# Altium schematic symbol library TI Amplifiers and Linear Special Function Amplifier.SchLib: 708 symbols (part 3 of 34)
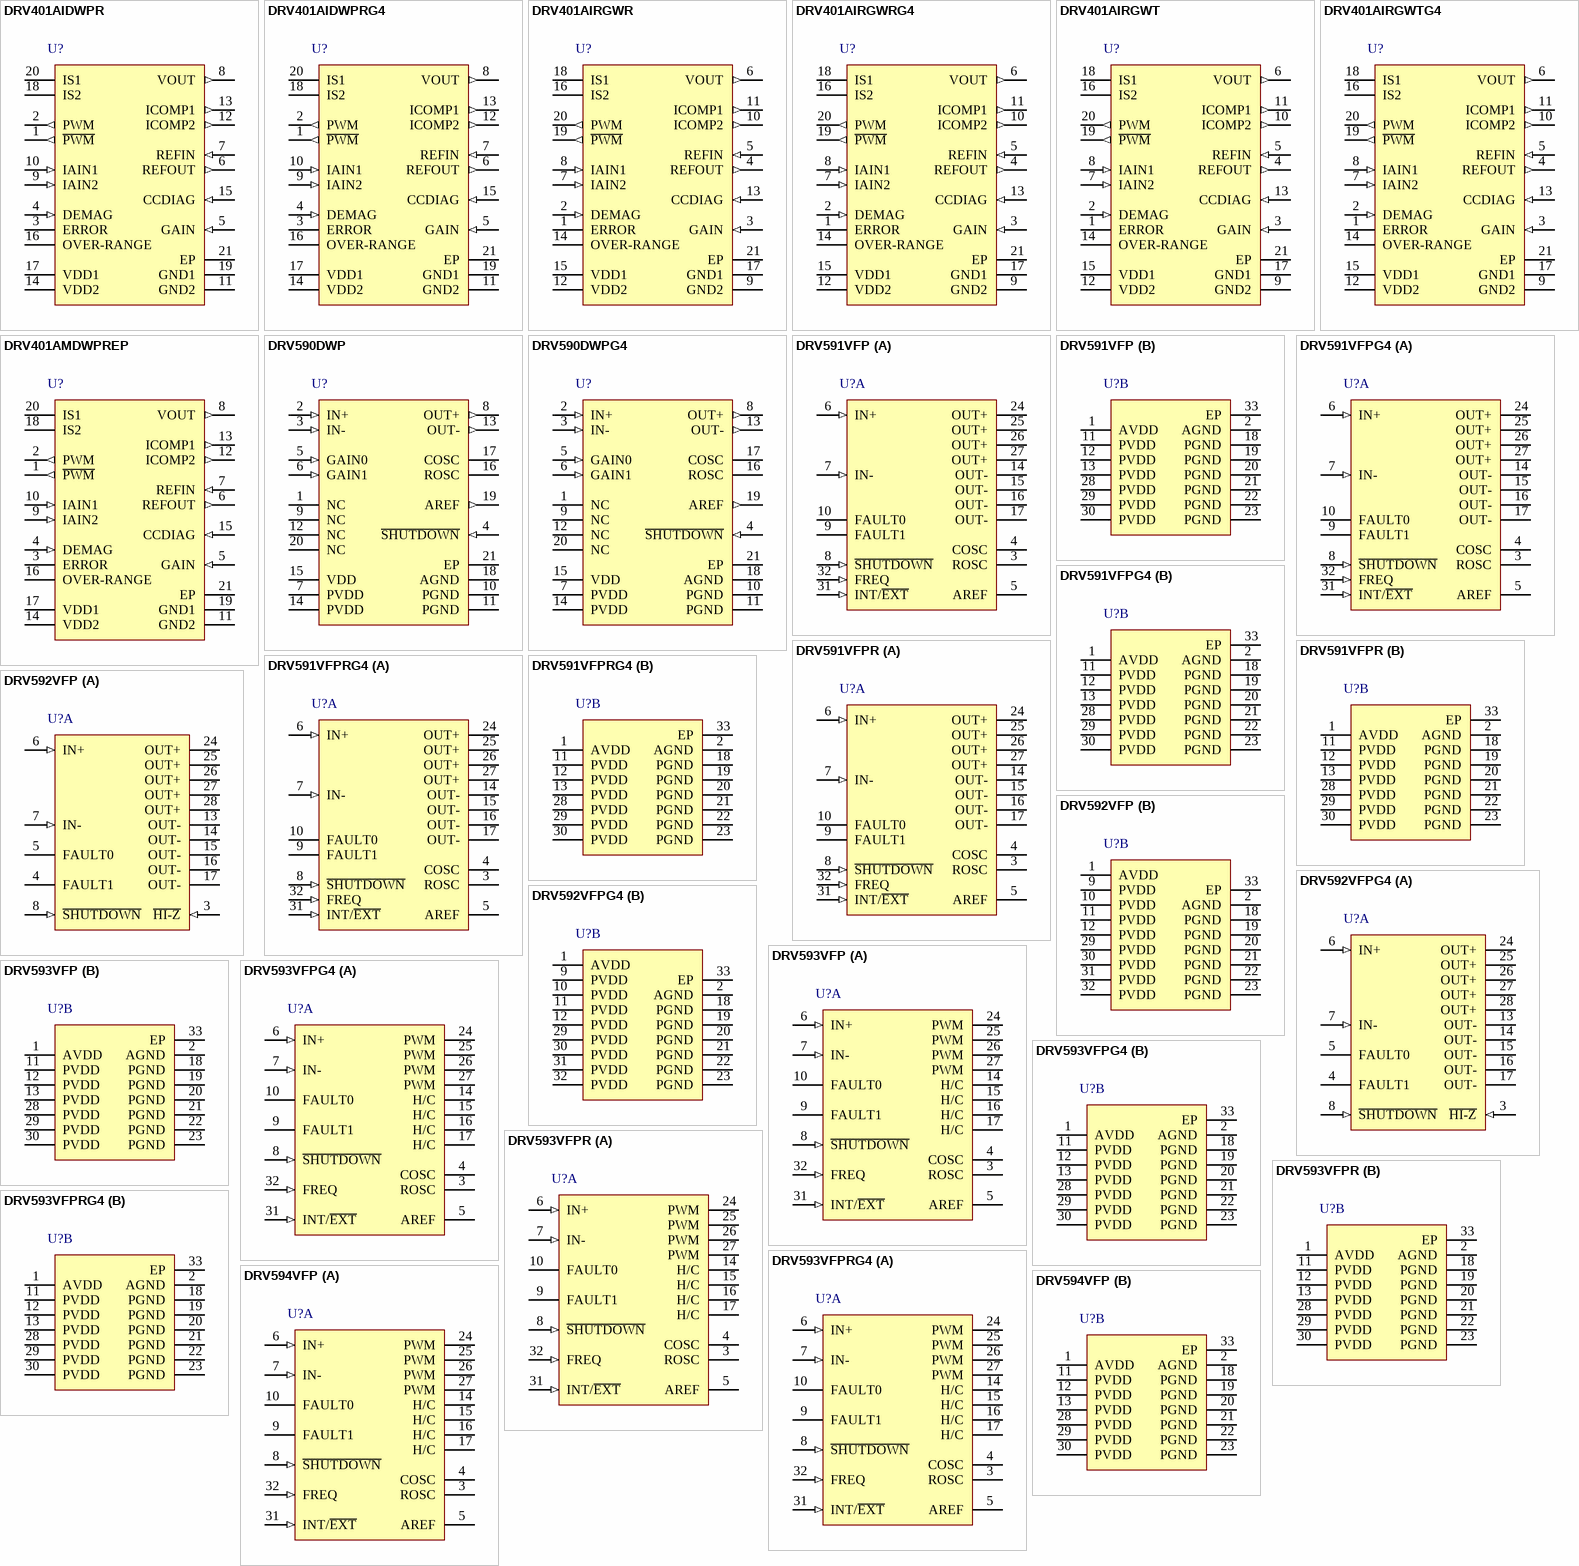
[diagram p41: symbols DRV401AIDWPR to DRV594VFP]

## DRV593VFPG4
designator U?
+/-3 A High-Efficiency PWM Power Driver, -40 to 85 degC, 32-pin QFP (VFP32); Manufacturer: Texas Instruments; PartNumber: DRV593VFPG4; Iq(mA): 4; Iq(Max)(mA): 12; rDS(on)(Ohms): 0.06; Thermal Shutdown: TRUE; Vs(Max)(V): 5.5; Vs(Min)(V): 2.8; DatasheetVersion: SLOS401C; PackageVersion: 4200791/C, 04/2012; PackageReference: VFP32-3505X3505TP; PackageDescription: 32-Pin PowerPAD(TM) Plastic Quad Flatpack, Body 7 x 7 mm, Pitch 0.8 mm; Supplier 1: Mouser; Supplier Part Number 1: N/A; Mounting Technology: Surface Mount; Code_JEDEC: MS-026; ComponentLink1Description: Manufacturer URL; ComponentLink1URL: http://www.ti.com/; ComponentLink2Description: Datasheet; ComponentLink2URL: http://www.ti.com/general/docs/lit/getliterature.tsp?genericPartNumber=DRV593&fileType=pdf; ComponentLink3Description: Package Specification; ComponentLink3URL: http://www.ti.com/lit/ml/mpqf098b/mpqf098b.pdf
footprint TI-VFP32-3505X3505TP_N (QFP, 32-Leads, Body 7x7mm, Pitch 0.8mm, Thermal Pad 3.505x3.505mm, IPC Medium Density)
footprint TI-VFP32-3505X3505TP_L (QFP, 32-Leads, Body 7x7mm, Pitch 0.8mm, Thermal Pad 3.505x3.505mm, IPC High Density)
footprint TI-VFP32-3505X3505TP_M (QFP, 32-Leads, Body 7x7mm, Pitch 0.8mm, Thermal Pad 3.505x3.505mm, IPC Low Density)
part A pins: 3 ROSC "Connect 120-kohm resistor to AGND to set oscillation frequency (either 500 kHz or 100 kHz). Not needed if an external clock is used", 4 COSC "Connect capacitor to ground to set oscillation frequency (220 pF for 500 kHz, 1 nF for 100 kHz) when the internal oscillator is selected; connect clock signal when an external oscillator is used", 5 AREF "Connect 1uF capacitor to ground for AREF voltage filtering", 6 IN+ (in) "Positive differential input", 7 IN- (in) "Negative differential input", 8 ~{SHUTDOWN} (in) "Places the amplifier in shutdown mode when a TTL logic low is applied to this terminal; places the amplifier in normal operation when a TTL logic high is applied", 9 FAULT1 (oc) "Fault flag 1, high when active open drain output (see application information)", 10 FAULT0 (oc) "Fault flag 0, low when active open drain output (see application information)", 14 H/C (hiz) "Direction control output for heat and cool modes (4 pins)", 15 H/C (hiz) "Direction control output for heat and cool modes (4 pins)", 16 H/C (hiz) "Direction control output for heat and cool modes (4 pins)", 17 H/C (hiz) "Direction control output for heat and cool modes (4 pins)", 24 PWM (hiz) "PWM output for voltage magnitude (4 pins)", 25 PWM (hiz) "PWM output for voltage magnitude (4 pins)", 26 PWM (hiz) "PWM output for voltage magnitude (4 pins)", 27 PWM (hiz) "PWM output for voltage magnitude (4 pins)", 31 INT/~{EXT} (in) "Selects the internal oscillator when a TTL logic high is applied to this terminal; selects the use of an external oscillator when a TTL logic low is applied to this terminal", 32 FREQ (in) "Selects 500 kHz switching frequency when a TTL logic low is applied to this terminal; selects 100 kHz switching frequency when a TTL logic high is applied"
part B pins: 1 AVDD (power) "Analog power supply", 2 AGND (power) "Analog ground", 11 PVDD (power) "High-current power supply (6 pins)", 12 PVDD (power) "High-current power supply (6 pins)", 13 PVDD (power) "High-current power supply (6 pins)", 18 PGND (power) "High-current ground (6 pins)", 19 PGND (power) "High-current ground (6 pins)", 20 PGND (power) "High-current ground (6 pins)", 21 PGND (power) "High-current ground (6 pins)", 22 PGND (power) "High-current ground (6 pins)", 23 PGND (power) "High-current ground (6 pins)", 28 PVDD (power) "High-current power supply (6 pins)", 29 PVDD (power) "High-current power supply (6 pins)", 30 PVDD (power) "High-current power supply (6 pins)", 33 EP (power) "Exposed thermal pad"

## DRV593VFPR
designator U?
+/-3 A High-Efficiency PWM Power Driver, -40 to 85 degC, 32-pin QFP (VFP32), Green (RoHS & no Sb/Br); Manufacturer: Texas Instruments; PartNumber: DRV593VFPR; Iq(mA): 4; Iq(Max)(mA): 12; rDS(on)(Ohms): 0.06; Thermal Shutdown: TRUE; Vs(Max)(V): 5.5; Vs(Min)(V): 2.8; DatasheetVersion: SLOS401C; PackageVersion: 4200791/C, 04/2012; PackageReference: VFP32-3505X3505TP; PackageDescription: 32-Pin PowerPAD(TM) Plastic Quad Flatpack, Body 7 x 7 mm, Pitch 0.8 mm; Supplier 1: Digi-Key; Supplier Part Number 1: 296-13643-2-ND; Supplier 2: Digi-Key; Supplier Part Number 2: 296-13643-1-ND; Supplier 3: Digi-Key; Supplier Part Number 3: 296-13643-6-ND; Supplier 4: Farnell; Supplier Part Number 4: 1212391; Supplier 5: Newark; Supplier Part Number 5: 02E2694; Supplier 6: Newark; Supplier Part Number 6: 28X3374; Supplier 7: Mouser; Supplier Part Number 7: 595-DRV593VFPR; Eco-Plan: Green (RoHS & no Sb/Br); Mounting Technology: Surface Mount; Code_JEDEC: MS-026; ComponentLink1Description: Manufacturer URL; ComponentLink1URL: http://www.ti.com/; ComponentLink2Description: Datasheet; ComponentLink2URL: http://www.ti.com/general/docs/lit/getliterature.tsp?genericPartNumber=DRV593&fileType=pdf; ComponentLink3Description: Package Specification; ComponentLink3URL: http://www.ti.com/lit/ml/mpqf098b/mpqf098b.pdf
footprint TI-VFP32-3505X3505TP_N (QFP, 32-Leads, Body 7x7mm, Pitch 0.8mm, Thermal Pad 3.505x3.505mm, IPC Medium Density)
footprint TI-VFP32-3505X3505TP_L (QFP, 32-Leads, Body 7x7mm, Pitch 0.8mm, Thermal Pad 3.505x3.505mm, IPC High Density)
footprint TI-VFP32-3505X3505TP_M (QFP, 32-Leads, Body 7x7mm, Pitch 0.8mm, Thermal Pad 3.505x3.505mm, IPC Low Density)
part A pins: 3 ROSC "Connect 120-kohm resistor to AGND to set oscillation frequency (either 500 kHz or 100 kHz). Not needed if an external clock is used", 4 COSC "Connect capacitor to ground to set oscillation frequency (220 pF for 500 kHz, 1 nF for 100 kHz) when the internal oscillator is selected; connect clock signal when an external oscillator is used", 5 AREF "Connect 1uF capacitor to ground for AREF voltage filtering", 6 IN+ (in) "Positive differential input", 7 IN- (in) "Negative differential input", 8 ~{SHUTDOWN} (in) "Places the amplifier in shutdown mode when a TTL logic low is applied to this terminal; places the amplifier in normal operation when a TTL logic high is applied", 9 FAULT1 (oc) "Fault flag 1, high when active open drain output (see application information)", 10 FAULT0 (oc) "Fault flag 0, low when active open drain output (see application information)", 14 H/C (hiz) "Direction control output for heat and cool modes (4 pins)", 15 H/C (hiz) "Direction control output for heat and cool modes (4 pins)", 16 H/C (hiz) "Direction control output for heat and cool modes (4 pins)", 17 H/C (hiz) "Direction control output for heat and cool modes (4 pins)", 24 PWM (hiz) "PWM output for voltage magnitude (4 pins)", 25 PWM (hiz) "PWM output for voltage magnitude (4 pins)", 26 PWM (hiz) "PWM output for voltage magnitude (4 pins)", 27 PWM (hiz) "PWM output for voltage magnitude (4 pins)", 31 INT/~{EXT} (in) "Selects the internal oscillator when a TTL logic high is applied to this terminal; selects the use of an external oscillator when a TTL logic low is applied to this terminal", 32 FREQ (in) "Selects 500 kHz switching frequency when a TTL logic low is applied to this terminal; selects 100 kHz switching frequency when a TTL logic high is applied"
part B pins: 1 AVDD (power) "Analog power supply", 2 AGND (power) "Analog ground", 11 PVDD (power) "High-current power supply (6 pins)", 12 PVDD (power) "High-current power supply (6 pins)", 13 PVDD (power) "High-current power supply (6 pins)", 18 PGND (power) "High-current ground (6 pins)", 19 PGND (power) "High-current ground (6 pins)", 20 PGND (power) "High-current ground (6 pins)", 21 PGND (power) "High-current ground (6 pins)", 22 PGND (power) "High-current ground (6 pins)", 23 PGND (power) "High-current ground (6 pins)", 28 PVDD (power) "High-current power supply (6 pins)", 29 PVDD (power) "High-current power supply (6 pins)", 30 PVDD (power) "High-current power supply (6 pins)", 33 EP (power) "Exposed thermal pad"

## DRV593VFPRG4
designator U?
+/-3 A High-Efficiency PWM Power Driver, -40 to 85 degC, 32-pin QFP (VFP32); Manufacturer: Texas Instruments; PartNumber: DRV593VFPRG4; Iq(mA): 4; Iq(Max)(mA): 12; rDS(on)(Ohms): 0.06; Thermal Shutdown: TRUE; Vs(Max)(V): 5.5; Vs(Min)(V): 2.8; DatasheetVersion: SLOS401C; PackageVersion: 4200791/C, 04/2012; PackageReference: VFP32-3505X3505TP; PackageDescription: 32-Pin PowerPAD(TM) Plastic Quad Flatpack, Body 7 x 7 mm, Pitch 0.8 mm; Supplier 1: Mouser; Supplier Part Number 1: N/A; Mounting Technology: Surface Mount; Code_JEDEC: MS-026; ComponentLink1Description: Manufacturer URL; ComponentLink1URL: http://www.ti.com/; ComponentLink2Description: Datasheet; ComponentLink2URL: http://www.ti.com/general/docs/lit/getliterature.tsp?genericPartNumber=DRV593&fileType=pdf; ComponentLink3Description: Package Specification; ComponentLink3URL: http://www.ti.com/lit/ml/mpqf098b/mpqf098b.pdf
footprint TI-VFP32-3505X3505TP_N (QFP, 32-Leads, Body 7x7mm, Pitch 0.8mm, Thermal Pad 3.505x3.505mm, IPC Medium Density)
footprint TI-VFP32-3505X3505TP_L (QFP, 32-Leads, Body 7x7mm, Pitch 0.8mm, Thermal Pad 3.505x3.505mm, IPC High Density)
footprint TI-VFP32-3505X3505TP_M (QFP, 32-Leads, Body 7x7mm, Pitch 0.8mm, Thermal Pad 3.505x3.505mm, IPC Low Density)
part A pins: 3 ROSC "Connect 120-kohm resistor to AGND to set oscillation frequency (either 500 kHz or 100 kHz). Not needed if an external clock is used", 4 COSC "Connect capacitor to ground to set oscillation frequency (220 pF for 500 kHz, 1 nF for 100 kHz) when the internal oscillator is selected; connect clock signal when an external oscillator is used", 5 AREF "Connect 1uF capacitor to ground for AREF voltage filtering", 6 IN+ (in) "Positive differential input", 7 IN- (in) "Negative differential input", 8 ~{SHUTDOWN} (in) "Places the amplifier in shutdown mode when a TTL logic low is applied to this terminal; places the amplifier in normal operation when a TTL logic high is applied", 9 FAULT1 (oc) "Fault flag 1, high when active open drain output (see application information)", 10 FAULT0 (oc) "Fault flag 0, low when active open drain output (see application information)", 14 H/C (hiz) "Direction control output for heat and cool modes (4 pins)", 15 H/C (hiz) "Direction control output for heat and cool modes (4 pins)", 16 H/C (hiz) "Direction control output for heat and cool modes (4 pins)", 17 H/C (hiz) "Direction control output for heat and cool modes (4 pins)", 24 PWM (hiz) "PWM output for voltage magnitude (4 pins)", 25 PWM (hiz) "PWM output for voltage magnitude (4 pins)", 26 PWM (hiz) "PWM output for voltage magnitude (4 pins)", 27 PWM (hiz) "PWM output for voltage magnitude (4 pins)", 31 INT/~{EXT} (in) "Selects the internal oscillator when a TTL logic high is applied to this terminal; selects the use of an external oscillator when a TTL logic low is applied to this terminal", 32 FREQ (in) "Selects 500 kHz switching frequency when a TTL logic low is applied to this terminal; selects 100 kHz switching frequency when a TTL logic high is applied"
part B pins: 1 AVDD (power) "Analog power supply", 2 AGND (power) "Analog ground", 11 PVDD (power) "High-current power supply (6 pins)", 12 PVDD (power) "High-current power supply (6 pins)", 13 PVDD (power) "High-current power supply (6 pins)", 18 PGND (power) "High-current ground (6 pins)", 19 PGND (power) "High-current ground (6 pins)", 20 PGND (power) "High-current ground (6 pins)", 21 PGND (power) "High-current ground (6 pins)", 22 PGND (power) "High-current ground (6 pins)", 23 PGND (power) "High-current ground (6 pins)", 28 PVDD (power) "High-current power supply (6 pins)", 29 PVDD (power) "High-current power supply (6 pins)", 30 PVDD (power) "High-current power supply (6 pins)", 33 EP (power) "Exposed thermal pad"

## DRV594VFP
designator U?
+/-3 A High-Efficiency PWM Power Driver, -40 to 85 degC, 32-pin QFP (VFP32), Green (RoHS & no Sb/Br); Manufacturer: Texas Instruments; PartNumber: DRV594VFP; Iq(mA): 4; Iq(Max)(mA): 12; rDS(on)(Ohms): 0.06; Thermal Shutdown: TRUE; Vs(Max)(V): 5.5; Vs(Min)(V): 2.8; DatasheetVersion: SLOS401C; PackageVersion: 4200791/C, 04/2012; PackageReference: VFP32-3505X3505TP; PackageDescription: 32-Pin PowerPAD(TM) Plastic Quad Flatpack, Body 7 x 7 mm, Pitch 0.8 mm; Supplier 1: Digi-Key; Supplier Part Number 1: DRV594VFP-ND; Supplier 2: Newark; Supplier Part Number 2: 03P0856; Supplier 3: Mouser; Supplier Part Number 3: 595-DRV594VFP; Eco-Plan: Green (RoHS & no Sb/Br); Mounting Technology: Surface Mount; Code_JEDEC: MS-026; ComponentLink1Description: Manufacturer URL; ComponentLink1URL: http://www.ti.com/; ComponentLink2Description: Datasheet; ComponentLink2URL: http://www.ti.com/general/docs/lit/getliterature.tsp?genericPartNumber=DRV594&fileType=pdf; ComponentLink3Description: Package Specification; ComponentLink3URL: http://www.ti.com/lit/ml/mpqf098b/mpqf098b.pdf
footprint TI-VFP32-3505X3505TP_N (QFP, 32-Leads, Body 7x7mm, Pitch 0.8mm, Thermal Pad 3.505x3.505mm, IPC Medium Density)
footprint TI-VFP32-3505X3505TP_L (QFP, 32-Leads, Body 7x7mm, Pitch 0.8mm, Thermal Pad 3.505x3.505mm, IPC High Density)
footprint TI-VFP32-3505X3505TP_M (QFP, 32-Leads, Body 7x7mm, Pitch 0.8mm, Thermal Pad 3.505x3.505mm, IPC Low Density)
part A pins: 3 ROSC "Connect 120-kohm resistor to AGND to set oscillation frequency (either 500 kHz or 100 kHz). Not needed if an external clock is used", 4 COSC "Connect capacitor to ground to set oscillation frequency (220 pF for 500 kHz, 1 nF for 100 kHz) when the internal oscillator is selected; connect clock signal when an external oscillator is used", 5 AREF "Connect 1uF capacitor to ground for AREF voltage filtering", 6 IN+ (in) "Positive differential input", 7 IN- (in) "Negative differential input", 8 ~{SHUTDOWN} (in) "Places the amplifier in shutdown mode when a TTL logic low is applied to this terminal; places the amplifier in normal operation when a TTL logic high is applied", 9 FAULT1 (oc) "Fault flag 1, high when active open drain output (see application information)", 10 FAULT0 (oc) "Fault flag 0, low when active open drain output (see application information)", 14 H/C (hiz) "Direction control output for heat and cool modes (4 pins)", 15 H/C (hiz) "Direction control output for heat and cool modes (4 pins)", 16 H/C (hiz) "Direction control output for heat and cool modes (4 pins)", 17 H/C (hiz) "Direction control output for heat and cool modes (4 pins)", 24 PWM (hiz) "PWM output for voltage magnitude (4 pins)", 25 PWM (hiz) "PWM output for voltage magnitude (4 pins)", 26 PWM (hiz) "PWM output for voltage magnitude (4 pins)", 27 PWM (hiz) "PWM output for voltage magnitude (4 pins)", 31 INT/~{EXT} (in) "Selects the internal oscillator when a TTL logic high is applied to this terminal; selects the use of an external oscillator when a TTL logic low is applied to this terminal", 32 FREQ (in) "Selects 500 kHz switching frequency when a TTL logic low is applied to this terminal; selects 100 kHz switching frequency when a TTL logic high is applied"
part B pins: 1 AVDD (power) "Analog power supply", 2 AGND (power) "Analog ground", 11 PVDD (power) "High-current power supply (6 pins)", 12 PVDD (power) "High-current power supply (6 pins)", 13 PVDD (power) "High-current power supply (6 pins)", 18 PGND (power) "High-current ground (6 pins)", 19 PGND (power) "High-current ground (6 pins)", 20 PGND (power) "High-current ground (6 pins)", 21 PGND (power) "High-current ground (6 pins)", 22 PGND (power) "High-current ground (6 pins)", 23 PGND (power) "High-current ground (6 pins)", 28 PVDD (power) "High-current power supply (6 pins)", 29 PVDD (power) "High-current power supply (6 pins)", 30 PVDD (power) "High-current power supply (6 pins)", 33 EP (power) "Exposed thermal pad"

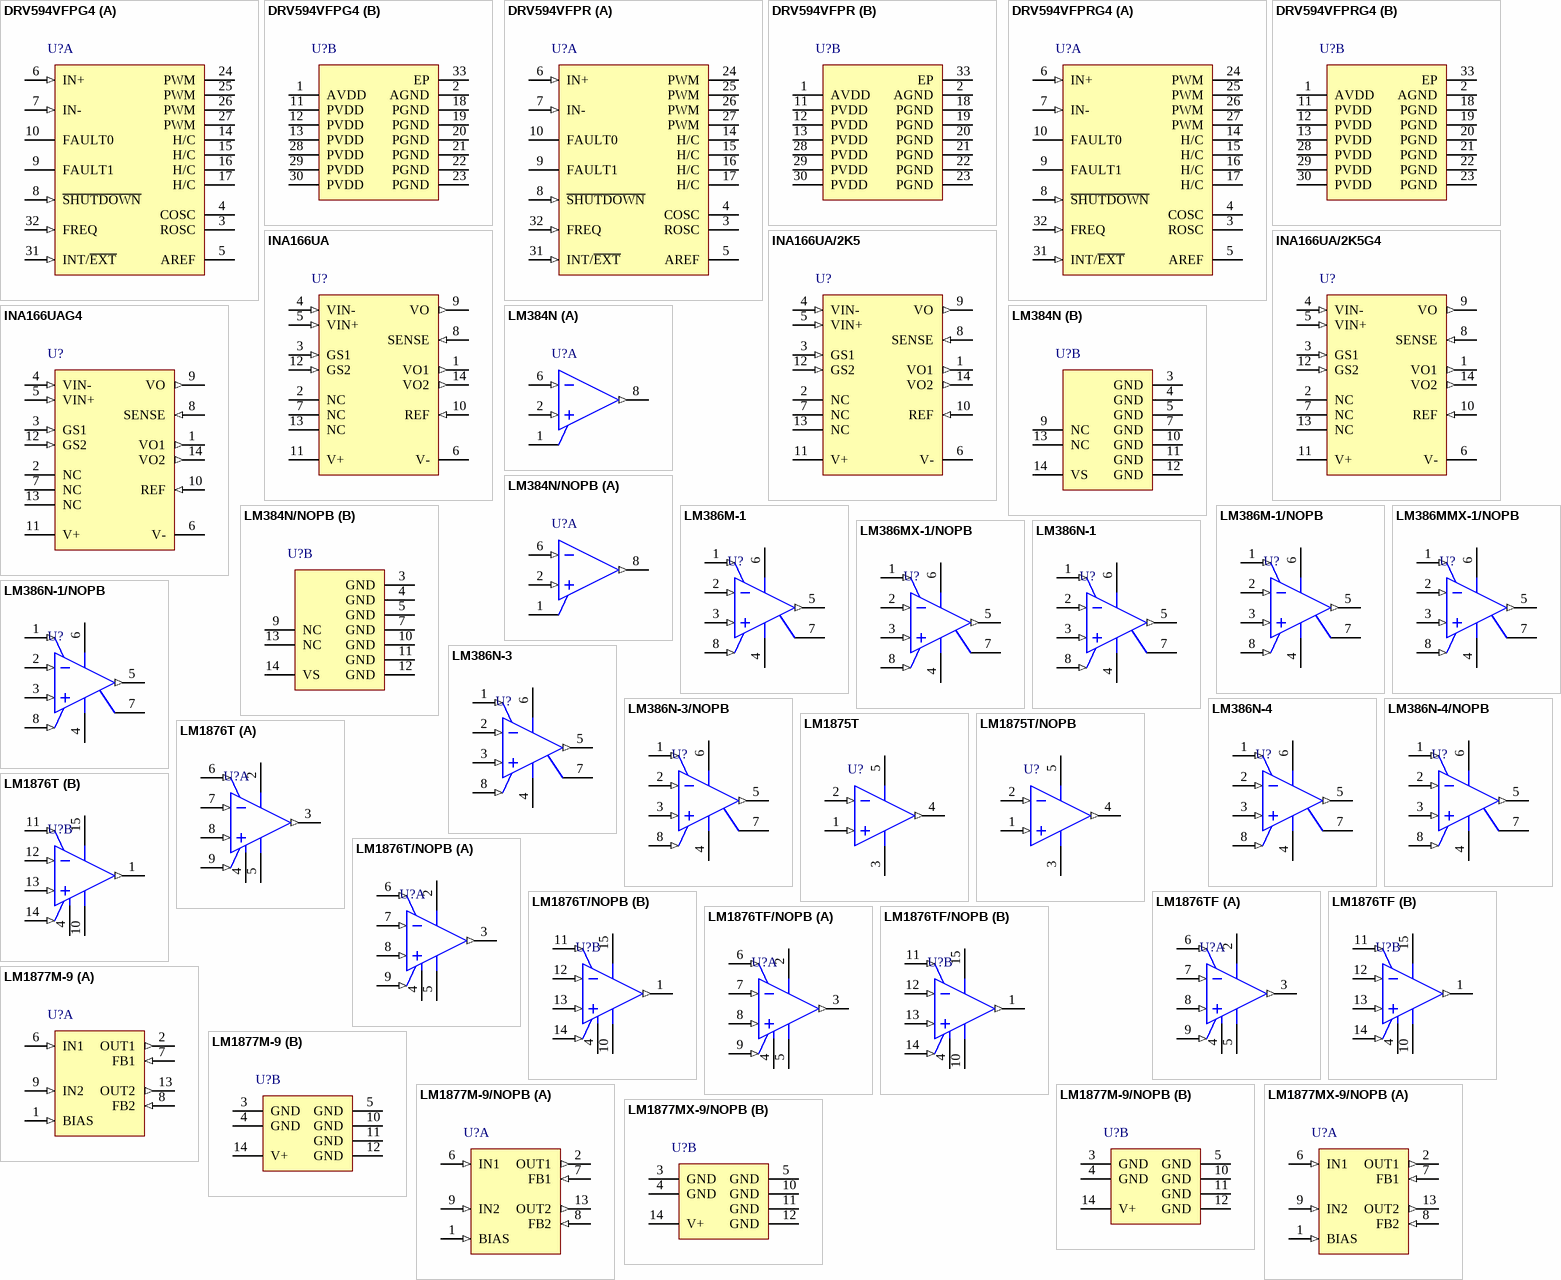
[diagram p2: symbols DRV594VFPG4 to LM1877MX-9/NOPB]

## DRV594VFPG4
designator U?
+/-3 A High-Efficiency PWM Power Driver, -40 to 85 degC, 32-pin QFP (VFP32); Manufacturer: Texas Instruments; PartNumber: DRV594VFPG4; Iq(mA): 4; Iq(Max)(mA): 12; rDS(on)(Ohms): 0.06; Thermal Shutdown: TRUE; Vs(Max)(V): 5.5; Vs(Min)(V): 2.8; DatasheetVersion: SLOS401C; PackageVersion: 4200791/C, 04/2012; PackageReference: VFP32-3505X3505TP; PackageDescription: 32-Pin PowerPAD(TM) Plastic Quad Flatpack, Body 7 x 7 mm, Pitch 0.8 mm; Supplier 1: Mouser; Supplier Part Number 1: N/A; Mounting Technology: Surface Mount; Code_JEDEC: MS-026; ComponentLink1Description: Manufacturer URL; ComponentLink1URL: http://www.ti.com/; ComponentLink2Description: Datasheet; ComponentLink2URL: http://www.ti.com/general/docs/lit/getliterature.tsp?genericPartNumber=DRV594&fileType=pdf; ComponentLink3Description: Package Specification; ComponentLink3URL: http://www.ti.com/lit/ml/mpqf098b/mpqf098b.pdf
footprint TI-VFP32-3505X3505TP_N (QFP, 32-Leads, Body 7x7mm, Pitch 0.8mm, Thermal Pad 3.505x3.505mm, IPC Medium Density)
footprint TI-VFP32-3505X3505TP_L (QFP, 32-Leads, Body 7x7mm, Pitch 0.8mm, Thermal Pad 3.505x3.505mm, IPC High Density)
footprint TI-VFP32-3505X3505TP_M (QFP, 32-Leads, Body 7x7mm, Pitch 0.8mm, Thermal Pad 3.505x3.505mm, IPC Low Density)
part A pins: 3 ROSC "Connect 120-kohm resistor to AGND to set oscillation frequency (either 500 kHz or 100 kHz). Not needed if an external clock is used", 4 COSC "Connect capacitor to ground to set oscillation frequency (220 pF for 500 kHz, 1 nF for 100 kHz) when the internal oscillator is selected; connect clock signal when an external oscillator is used", 5 AREF "Connect 1uF capacitor to ground for AREF voltage filtering", 6 IN+ (in) "Positive differential input", 7 IN- (in) "Negative differential input", 8 ~{SHUTDOWN} (in) "Places the amplifier in shutdown mode when a TTL logic low is applied to this terminal; places the amplifier in normal operation when a TTL logic high is applied", 9 FAULT1 (oc) "Fault flag 1, high when active open drain output (see application information)", 10 FAULT0 (oc) "Fault flag 0, low when active open drain output (see application information)", 14 H/C (hiz) "Direction control output for heat and cool modes (4 pins)", 15 H/C (hiz) "Direction control output for heat and cool modes (4 pins)", 16 H/C (hiz) "Direction control output for heat and cool modes (4 pins)", 17 H/C (hiz) "Direction control output for heat and cool modes (4 pins)", 24 PWM (hiz) "PWM output for voltage magnitude (4 pins)", 25 PWM (hiz) "PWM output for voltage magnitude (4 pins)", 26 PWM (hiz) "PWM output for voltage magnitude (4 pins)", 27 PWM (hiz) "PWM output for voltage magnitude (4 pins)", 31 INT/~{EXT} (in) "Selects the internal oscillator when a TTL logic high is applied to this terminal; selects the use of an external oscillator when a TTL logic low is applied to this terminal", 32 FREQ (in) "Selects 500 kHz switching frequency when a TTL logic low is applied to this terminal; selects 100 kHz switching frequency when a TTL logic high is applied"
part B pins: 1 AVDD (power) "Analog power supply", 2 AGND (power) "Analog ground", 11 PVDD (power) "High-current power supply (6 pins)", 12 PVDD (power) "High-current power supply (6 pins)", 13 PVDD (power) "High-current power supply (6 pins)", 18 PGND (power) "High-current ground (6 pins)", 19 PGND (power) "High-current ground (6 pins)", 20 PGND (power) "High-current ground (6 pins)", 21 PGND (power) "High-current ground (6 pins)", 22 PGND (power) "High-current ground (6 pins)", 23 PGND (power) "High-current ground (6 pins)", 28 PVDD (power) "High-current power supply (6 pins)", 29 PVDD (power) "High-current power supply (6 pins)", 30 PVDD (power) "High-current power supply (6 pins)", 33 EP (power) "Exposed thermal pad"

## DRV594VFPR
designator U?
+/-3 A High-Efficiency PWM Power Driver, -40 to 85 degC, 32-pin QFP (VFP32), Green (RoHS & no Sb/Br); Manufacturer: Texas Instruments; PartNumber: DRV594VFPR; Iq(mA): 4; Iq(Max)(mA): 12; rDS(on)(Ohms): 0.06; Thermal Shutdown: TRUE; Vs(Max)(V): 5.5; Vs(Min)(V): 2.8; DatasheetVersion: SLOS401C; PackageVersion: 4200791/C, 04/2012; PackageReference: VFP32-3505X3505TP; PackageDescription: 32-Pin PowerPAD(TM) Plastic Quad Flatpack, Body 7 x 7 mm, Pitch 0.8 mm; Supplier 1: Digi-Key; Supplier Part Number 1: 296-13644-2-ND; Supplier 2: Digi-Key; Supplier Part Number 2: 296-13644-1-ND; Supplier 3: Digi-Key; Supplier Part Number 3: 296-13644-6-ND; Supplier 4: Newark; Supplier Part Number 4: 02E2697; Supplier 5: Mouser; Supplier Part Number 5: 595-DRV594VFPR; Eco-Plan: Green (RoHS & no Sb/Br); Mounting Technology: Surface Mount; Code_JEDEC: MS-026; ComponentLink1Description: Manufacturer URL; ComponentLink1URL: http://www.ti.com/; ComponentLink2Description: Datasheet; ComponentLink2URL: http://www.ti.com/general/docs/lit/getliterature.tsp?genericPartNumber=DRV594&fileType=pdf; ComponentLink3Description: Package Specification; ComponentLink3URL: http://www.ti.com/lit/ml/mpqf098b/mpqf098b.pdf
footprint TI-VFP32-3505X3505TP_N (QFP, 32-Leads, Body 7x7mm, Pitch 0.8mm, Thermal Pad 3.505x3.505mm, IPC Medium Density)
footprint TI-VFP32-3505X3505TP_L (QFP, 32-Leads, Body 7x7mm, Pitch 0.8mm, Thermal Pad 3.505x3.505mm, IPC High Density)
footprint TI-VFP32-3505X3505TP_M (QFP, 32-Leads, Body 7x7mm, Pitch 0.8mm, Thermal Pad 3.505x3.505mm, IPC Low Density)
part A pins: 3 ROSC "Connect 120-kohm resistor to AGND to set oscillation frequency (either 500 kHz or 100 kHz). Not needed if an external clock is used", 4 COSC "Connect capacitor to ground to set oscillation frequency (220 pF for 500 kHz, 1 nF for 100 kHz) when the internal oscillator is selected; connect clock signal when an external oscillator is used", 5 AREF "Connect 1uF capacitor to ground for AREF voltage filtering", 6 IN+ (in) "Positive differential input", 7 IN- (in) "Negative differential input", 8 ~{SHUTDOWN} (in) "Places the amplifier in shutdown mode when a TTL logic low is applied to this terminal; places the amplifier in normal operation when a TTL logic high is applied", 9 FAULT1 (oc) "Fault flag 1, high when active open drain output (see application information)", 10 FAULT0 (oc) "Fault flag 0, low when active open drain output (see application information)", 14 H/C (hiz) "Direction control output for heat and cool modes (4 pins)", 15 H/C (hiz) "Direction control output for heat and cool modes (4 pins)", 16 H/C (hiz) "Direction control output for heat and cool modes (4 pins)", 17 H/C (hiz) "Direction control output for heat and cool modes (4 pins)", 24 PWM (hiz) "PWM output for voltage magnitude (4 pins)", 25 PWM (hiz) "PWM output for voltage magnitude (4 pins)", 26 PWM (hiz) "PWM output for voltage magnitude (4 pins)", 27 PWM (hiz) "PWM output for voltage magnitude (4 pins)", 31 INT/~{EXT} (in) "Selects the internal oscillator when a TTL logic high is applied to this terminal; selects the use of an external oscillator when a TTL logic low is applied to this terminal", 32 FREQ (in) "Selects 500 kHz switching frequency when a TTL logic low is applied to this terminal; selects 100 kHz switching frequency when a TTL logic high is applied"
part B pins: 1 AVDD (power) "Analog power supply", 2 AGND (power) "Analog ground", 11 PVDD (power) "High-current power supply (6 pins)", 12 PVDD (power) "High-current power supply (6 pins)", 13 PVDD (power) "High-current power supply (6 pins)", 18 PGND (power) "High-current ground (6 pins)", 19 PGND (power) "High-current ground (6 pins)", 20 PGND (power) "High-current ground (6 pins)", 21 PGND (power) "High-current ground (6 pins)", 22 PGND (power) "High-current ground (6 pins)", 23 PGND (power) "High-current ground (6 pins)", 28 PVDD (power) "High-current power supply (6 pins)", 29 PVDD (power) "High-current power supply (6 pins)", 30 PVDD (power) "High-current power supply (6 pins)", 33 EP (power) "Exposed thermal pad"

## DRV594VFPRG4
designator U?
+/-3 A High-Efficiency PWM Power Driver, -40 to 85 degC, 32-pin QFP (VFP32); Manufacturer: Texas Instruments; PartNumber: DRV594VFPRG4; Iq(mA): 4; Iq(Max)(mA): 12; rDS(on)(Ohms): 0.06; Thermal Shutdown: TRUE; Vs(Max)(V): 5.5; Vs(Min)(V): 2.8; DatasheetVersion: SLOS401C; PackageVersion: 4200791/C, 04/2012; PackageReference: VFP32-3505X3505TP; PackageDescription: 32-Pin PowerPAD(TM) Plastic Quad Flatpack, Body 7 x 7 mm, Pitch 0.8 mm; Supplier 1: Mouser; Supplier Part Number 1: N/A; Mounting Technology: Surface Mount; Code_JEDEC: MS-026; ComponentLink1Description: Manufacturer URL; ComponentLink1URL: http://www.ti.com/; ComponentLink2Description: Datasheet; ComponentLink2URL: http://www.ti.com/general/docs/lit/getliterature.tsp?genericPartNumber=DRV594&fileType=pdf; ComponentLink3Description: Package Specification; ComponentLink3URL: http://www.ti.com/lit/ml/mpqf098b/mpqf098b.pdf
footprint TI-VFP32-3505X3505TP_N (QFP, 32-Leads, Body 7x7mm, Pitch 0.8mm, Thermal Pad 3.505x3.505mm, IPC Medium Density)
footprint TI-VFP32-3505X3505TP_L (QFP, 32-Leads, Body 7x7mm, Pitch 0.8mm, Thermal Pad 3.505x3.505mm, IPC High Density)
footprint TI-VFP32-3505X3505TP_M (QFP, 32-Leads, Body 7x7mm, Pitch 0.8mm, Thermal Pad 3.505x3.505mm, IPC Low Density)
part A pins: 3 ROSC "Connect 120-kohm resistor to AGND to set oscillation frequency (either 500 kHz or 100 kHz). Not needed if an external clock is used", 4 COSC "Connect capacitor to ground to set oscillation frequency (220 pF for 500 kHz, 1 nF for 100 kHz) when the internal oscillator is selected; connect clock signal when an external oscillator is used", 5 AREF "Connect 1uF capacitor to ground for AREF voltage filtering", 6 IN+ (in) "Positive differential input", 7 IN- (in) "Negative differential input", 8 ~{SHUTDOWN} (in) "Places the amplifier in shutdown mode when a TTL logic low is applied to this terminal; places the amplifier in normal operation when a TTL logic high is applied", 9 FAULT1 (oc) "Fault flag 1, high when active open drain output (see application information)", 10 FAULT0 (oc) "Fault flag 0, low when active open drain output (see application information)", 14 H/C (hiz) "Direction control output for heat and cool modes (4 pins)", 15 H/C (hiz) "Direction control output for heat and cool modes (4 pins)", 16 H/C (hiz) "Direction control output for heat and cool modes (4 pins)", 17 H/C (hiz) "Direction control output for heat and cool modes (4 pins)", 24 PWM (hiz) "PWM output for voltage magnitude (4 pins)", 25 PWM (hiz) "PWM output for voltage magnitude (4 pins)", 26 PWM (hiz) "PWM output for voltage magnitude (4 pins)", 27 PWM (hiz) "PWM output for voltage magnitude (4 pins)", 31 INT/~{EXT} (in) "Selects the internal oscillator when a TTL logic high is applied to this terminal; selects the use of an external oscillator when a TTL logic low is applied to this terminal", 32 FREQ (in) "Selects 500 kHz switching frequency when a TTL logic low is applied to this terminal; selects 100 kHz switching frequency when a TTL logic high is applied"
part B pins: 1 AVDD (power) "Analog power supply", 2 AGND (power) "Analog ground", 11 PVDD (power) "High-current power supply (6 pins)", 12 PVDD (power) "High-current power supply (6 pins)", 13 PVDD (power) "High-current power supply (6 pins)", 18 PGND (power) "High-current ground (6 pins)", 19 PGND (power) "High-current ground (6 pins)", 20 PGND (power) "High-current ground (6 pins)", 21 PGND (power) "High-current ground (6 pins)", 22 PGND (power) "High-current ground (6 pins)", 23 PGND (power) "High-current ground (6 pins)", 28 PVDD (power) "High-current power supply (6 pins)", 29 PVDD (power) "High-current power supply (6 pins)", 30 PVDD (power) "High-current power supply (6 pins)", 33 EP (power) "Exposed thermal pad"